# Altium footprint library MiscDevices.PcbLib: 251 footprints (part 16 of 16)
Each footprint in its own frame and in the unit in brackets; x right, y up, seen from the top. Pads: shape width x height; smd on the part's side, far side on the other; paste and mask are expansions set on the pad; w line width, h text height; cw(c..) or ccw(c..) is an arc to the next point about the centre after c.
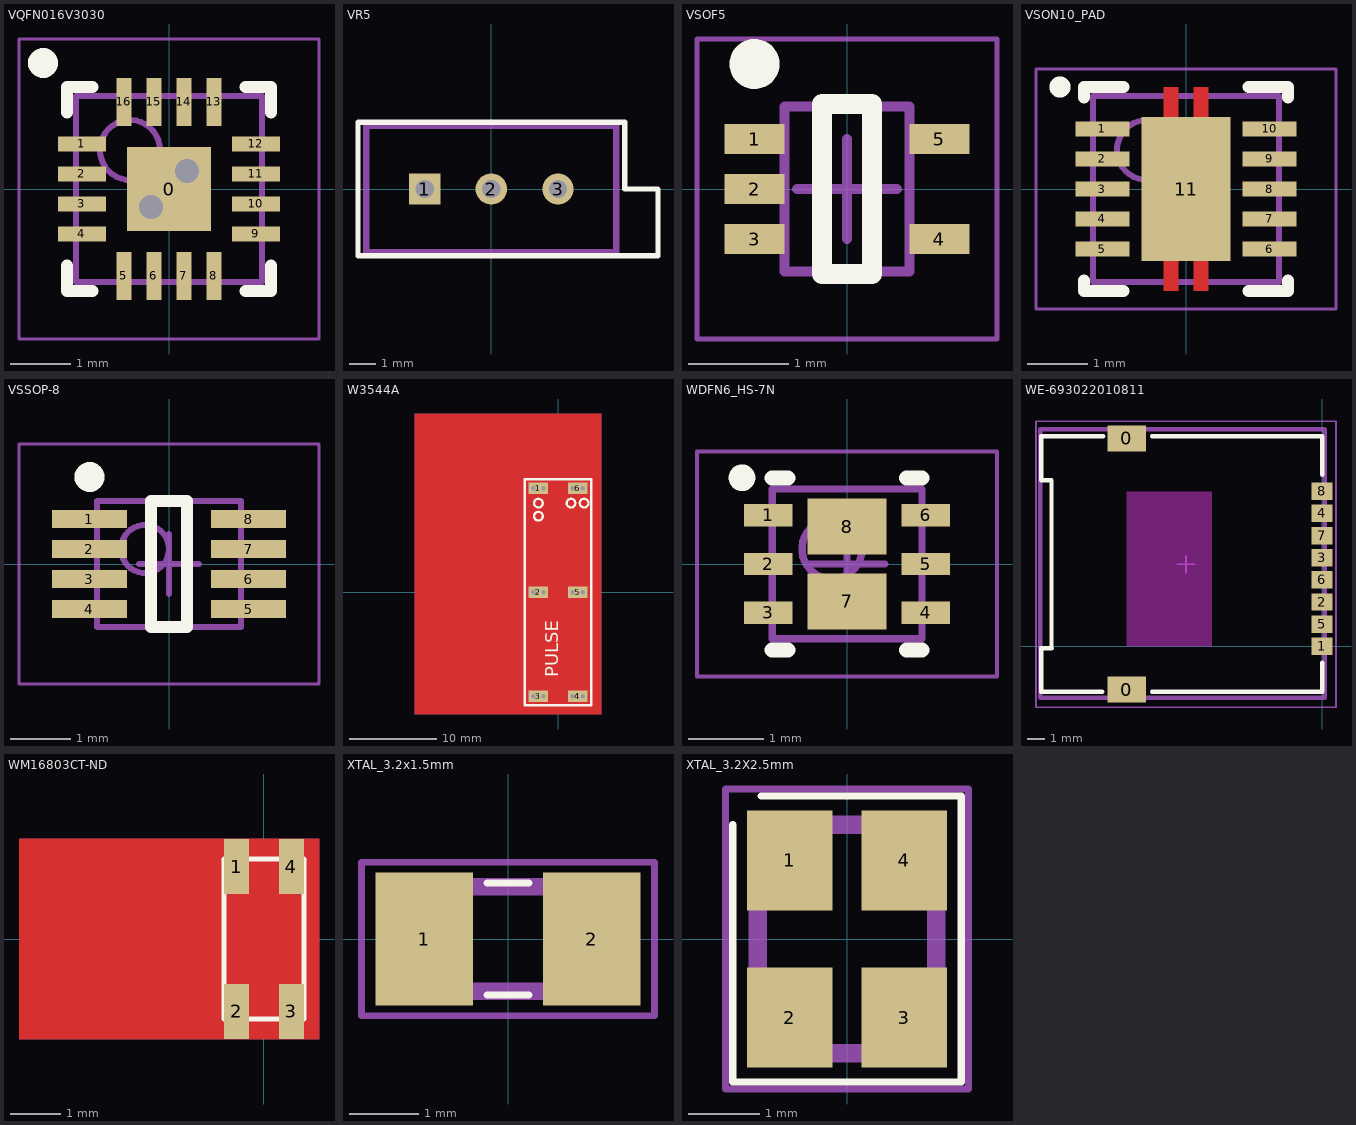
[diagram p15: the footprints below, top view; thin cyan lines are the x and y axes]

## VQFN016V3030 [mm] "QFN, 16-Leads, Body 3.00x3.00mm, Pitch 0.50mm, Thermal Pad 1.40x1.40mm, IPC Medium Density"
height 1
pads (17):
  rect 1.4x1.4 smd: 0(0,0)
  rect 0.8x0.25 smd: 1(-1.45,0.75) 2(-1.45,0.25) 3(-1.45,-0.25) 4(-1.45,-0.75) 9(1.45,-0.75) 10(1.45,-0.25) 11(1.45,0.25) 12(1.45,0.75)
  rect 0.25x0.8 smd: 5(-0.75,-1.45) 6(-0.25,-1.45) 7(0.25,-1.45) 8(0.75,-1.45) 13(0.75,1.45) 14(0.25,1.45) 15(-0.25,1.45) 16(-0.75,1.45)
via -0.3,-0.3 diameter 0.8 hole 0.4
via 0.3,0.3 diameter 0.8 hole 0.4
Top Overlay:
  circle w0.25: c-2.1,2.1 r0.125
  lines w0.2: -1.7,-1.275 -1.7,-1.7 -1.275,-1.7 ; -1.7,1.275 -1.7,1.7 -1.275,1.7 ; 1.275,-1.7 1.7,-1.7 1.7,-1.275 ; 1.275,1.7 1.7,1.7 1.7,1.275
Top Designator (Mech7):
  text ".Designator" at -3.809,-0.254 h0.76
Top Assembly:
  circle w0.1: c-0.65,0.65 r0.5
  lines w0.1: -1.55,-1.55 1.55,-1.55 1.55,1.55 -1.55,1.55 -1.55,-1.55
Top Courtyard:
  lines w0.05: -2.5,-2.5 2.5,-2.5 2.5,2.5 -2.5,2.5 -2.5,-2.5
  lines w0.1: -0.5,0 0.5,0 ; 0,-0.5 0,0.5
3D body "VQFN016V3030.step": height 1, standoff 0, extent -1.63,-1.63 1.63,1.63

## VR5 [mm] "Thru-Hole; 3 Leads"
height 18
pads (3):
  rect 1.2x1.2 hole 0.7: 1(-2.54,0)
  round 1.2 hole 0.7: 2(0,0) 3(2.54,0)
Top Overlay:
  lines w0.2: -5.08,-2.54 6.35,-2.54 6.35,0 5.08,0 5.08,2.54 -5.08,2.54 -5.08,-2.54
Top Designator (Mech7):
  text ".Designator" at -6.983,-0.508 h1.52
Top Assembly:
  lines w0.254: -4.765,-2.415 -4.765,2.415 4.765,2.415 4.765,-2.415 -4.765,-2.415
3D body "User Library-3296_Bourns.STEP": height 11.56, standoff -7.61, extent -4.765,-2.415 4.765,2.415

## VSOF5 [mm] "SOT23, 5-Leads, Body 1.60x1.60mm, Pitch 0.50mm, IPC Medium Density"
height 0.6
pads (5):
  rect 0.6x0.3 smd: 1(-0.925,0.5) 2(-0.925,0) 3(-0.925,-0.5) 4(0.925,-0.5) 5(0.925,0.5)
Top Overlay:
  circle w0.25: c-0.925,1.25 r0.125
  lines w0.2: -0.25,-0.85 0.25,-0.85 0.25,0.85 -0.25,0.85 -0.25,-0.85
Top Designator (Mech7):
  text ".Designator" at -3.809,-0.254 h0.76
Top Assembly:
  lines w0.1: -0.625,-0.825 -0.625,0.825 0.625,0.825 0.625,-0.825 -0.625,-0.825
Top Courtyard:
  lines w0.05: -1.5,-1.5 -1.5,1.5 1.5,1.5 1.5,-1.5 -1.5,-1.5
  lines w0.1: -0.5,0 0.5,0 ; 0,-0.5 0,0.5
3D body "User Library-SOTFL50P160X60-5N.STEP": height 0.6, standoff 0, extent -0.8,-0.823 0.8,0.823

## VSON10_PAD [mm]
height 1
pads (11):
  rect 0.9x0.25 smd: 1(-1.395,1) 2(-1.395,0.5) 3(-1.395,0) 4(-1.395,-0.5) 5(-1.395,-1) 6(1.395,-1) 7(1.395,-0.5) 8(1.395,0) 9(1.395,0.5) 10(1.395,1)
  rect 1.49x2.4 smd: 11(0,0)
Top Layer:
  rectangle: -0.375,1.2 -0.125,1.7
  rectangle: 0.125,1.2 0.375,1.7
  rectangle: 0.125,-1.7 0.375,-1.2
  rectangle: -0.375,-1.7 -0.125,-1.2
Top Overlay:
  circle w0.254: c-2.1,1.7 r0.05
  lines w0.2: -1.7,-1.525 -1.7,-1.7 -1.045,-1.7 ; -1.7,1.525 -1.7,1.7 -1.045,1.7 ; 1.045,-1.7 1.7,-1.7 1.7,-1.525 ; 1.045,1.7 1.7,1.7 1.7,1.525
Top Paste:
  rectangle: -0.375,-1.7 -0.125,-1.35
  rectangle: 0.125,-1.7 0.375,-1.35
  rectangle: 0.125,1.35 0.375,1.7
  rectangle: -0.375,1.35 -0.125,1.7
Top Solder:
  rectangle: -0.475,1.3 0.475,1.8
  rectangle: -0.475,-1.8 0.475,-1.3
Top Designator (Mech7):
  text ".Designator" at -6.094,-0.406 h1.22
Top Assembly:
  circle w0.1: c-0.65,0.65 r0.5
  lines w0.1: -1.55,-1.55 -1.55,1.55 1.55,1.55 1.55,-1.55 -1.55,-1.55
Top Courtyard:
  lines w0.05: -2.5,-2 -2.5,2 2.5,2 2.5,-2 -2.5,-2
  lines w0.1: -0.5,0 0.5,0 ; 0,-0.5 0,0.5
3D body "VSON10_PAD.step": height 1, standoff 0, extent -1.6,-1.55 1.6,1.55

## VSSOP-8 [mm] "TSSOP, 8-Leads, Body 2.00x2.30mm, Pitch 0.50mm, IPC Medium Density"
height 0.9
pads (8):
  rect 1.25x0.3 smd: 1(-1.325,0.75) 2(-1.325,0.25) 3(-1.325,-0.25) 4(-1.325,-0.75) 5(1.325,-0.75) 6(1.325,-0.25) 7(1.325,0.25) 8(1.325,0.75)
Top Overlay:
  circle w0.25: c-1.325,1.45 r0.125
  lines w0.2: -0.3,-1.05 0.3,-1.05 0.3,1.05 -0.3,1.05 -0.3,-1.05
Top Designator (Mech7):
  text ".Designator" at -6.094,-0.406 h1.22
Top Assembly:
  circle w0.1: c-0.4,0.25 r0.4
  lines w0.1: -1.2,-1.05 1.2,-1.05 1.2,1.05 -1.2,1.05 -1.2,-1.05
Top Courtyard:
  lines w0.05: -2.5,-2 2.5,-2 2.5,2 -2.5,2 -2.5,-2
  lines w0.1: -0.5,0 0.5,0 ; 0,-0.5 0,0.5
3D body "User Library-VSSOP8-1.STEP": height 0.9, standoff 0, extent -1.6,-1.05 1.6,1.05

## W3544A [mm] "PulseLarsen W3544A GSM/3G Antenna"
height 3
pads (6):
  rect 2.25x1.3 smd: 1(-2.27,11.95) 2(-2.27,0) 3(-2.27,-11.95) 4(2.27,-11.95) 5(2.27,0) 6(2.27,11.95)
via 1.67,11.95 diameter 1.016 hole 0.508
via 1.67,0 diameter 1.016 hole 0.508
via 1.67,-11.95 diameter 1.016 hole 0.508
via 2.87,11.95 diameter 1.016 hole 0.508
via 2.87,0 diameter 1.016 hole 0.508
via 2.87,-11.95 diameter 1.016 hole 0.508
via -2.87,11.95 diameter 1.016 hole 0.508
via -1.67,11.95 diameter 1.016 hole 0.508
via -1.67,-11.95 diameter 1.016 hole 0.508
via -1.67,0 diameter 1.016 hole 0.508
via -2.87,-11.95 diameter 1.016 hole 0.508
via -2.87,0 diameter 1.016 hole 0.508
Top Layer:
  pour cut-out: -16.5,20.5 -16.5,-14 5,-14 5,20.5
Bottom Layer:
  rectangle: -3.4,11.3 -1.15,12.6
  region: 3.4,12.6 1.15,12.6 1.15,11.3 3.4,11.3
  region: 3.4,0.65 1.15,0.65 1.15,-0.65 3.4,-0.65
  rectangle: -3.4,-0.65 -1.15,0.65
  region: 3.4,-11.3 1.15,-11.3 1.15,-12.6 3.4,-12.6
  rectangle: -3.4,-12.6 -1.15,-11.3
  pour cut-out: -16.5,-14 5,-14 5,20.5 -16.5,20.5
Top Overlay:
  circle w0.254: c1.5,10.25 r0.5
  circle w0.254: c3,10.25 r0.5
  circle w0.254: c-2.25,8.75 r0.5
  circle w0.254: c-2.25,10.25 r0.5
  lines w0.254: -3.825,-13 3.825,-13 3.825,13 -3.825,13 -3.825,-13
  text "PULSE" at 0,-9.75 h1.52
Bottom Solder:
  rectangle: -3.5,11.2 -1.05,12.7
  region: 3.5,12.7 1.05,12.7 1.05,11.2 3.5,11.2
  region: 3.5,0.75 1.05,0.75 1.05,-0.75 3.5,-0.75
  rectangle: -3.5,-0.75 -1.05,0.75
  region: 3.5,-11.2 1.05,-11.2 1.05,-12.7 3.5,-12.7
  rectangle: -3.5,-12.7 -1.05,-11.2
Top Designator (Mech7):
  text ".Designator" at -7.618,3.492 h1.52
Top Assembly:
  lines w0.254: -3.825,-13 3.825,-13 3.825,13 -3.825,13 -3.825,-13
Top Courtyard:
  circle w0.1: c-3.6,12.8 r0.25
  lines w0.1: -16.2,-13.7 4.5,-13.7 4.5,20 -16.2,20 -16.2,-13.7 ; -4,-13.2 -4,13.2 4,13.2 4,-13.2 -4,-13.2
3D body "w3544a.SLDPRT": height 3, standoff 0, extent -3.825,-13 3.825,13

## WDFN6_HS-7N [mm] "SON, 6-Leads, Body 2.00x2.00mm, Pitch 0.65mm, Thermal Pad 1.60x0.98mm, IPC Medium Density"
height 0.8
pads (8):
  rect 0.65x0.3 smd: 1(-1.05,0.65) 2(-1.05,0) 3(-1.05,-0.65) 4(1.05,-0.65) 5(1.05,0) 6(1.05,0.65)
  rect 1.05x0.75 smd: 7(0,-0.5) 8(0,0.5)
Top Overlay:
  circle w0.254: c-1.4,1.15 r0.05
  lines w0.2: -1,-1.15 -0.79,-1.15 ; -1,1.15 -0.79,1.15 ; 0.79,-1.15 1,-1.15 ; 0.79,1.15 1,1.15
Top Designator (Mech7):
  text ".Designator" at -3.809,-0.228 h0.76
Top Assembly:
  circle w0.1: c-0.2,0.2 r0.4
  lines w0.1: -1,-1 1,-1 1,1 -1,1 -1,-1
Top Courtyard:
  lines w0.05: -2,-1.5 2,-1.5 2,1.5 -2,1.5 -2,-1.5
  lines w0.1: -0.5,0 0.5,0 ; 0,-0.5 0,0.5
3D body: height 0.8, standoff 0.05, extent -1,-1 1,1

## WE-693022010811 [mm] "8-pos Connector Micro SIM SMD, R/A ,Hinged Lid,Wurth Electronics"
height 2
pads (10):
  rect 2.2x1.5 smd: 0(-11.2,-2.48) 0(-11.2,11.92)
  rect 1.2x1 smd: 1(0,0) 2(0,2.54) 3(0,5.08) 4(0,7.62) 5(0,1.27) 6(0,3.81) 7(0,6.35) 8(0,8.89)
Top Layer keep-out:
  rectangle: -11.2,0 -6.3,8.89
Top Overlay:
  lines w0.254: -16.1,12.01 -16.1,9.51 -15.51,9.51 -15.51,-0.09 -15.5,-0.1 -16.09,-0.1 -16.1,-0.11 -16.1,-2.61 -12.61,-2.61 ; -16.1,12.05 -12.55,12.05 ; -9.75,-2.61 0,-2.61 0,-0.94 ; -9.75,12.05 0,12.05 0,9.835 ; 0,9.835 0,9.835
Top Designator (Mech7):
  text ".Designator" at -15.418,5.992 h1.52
Top Assembly:
  lines w0.254: -16.15,12.45 -16.15,-2.95 0.15,-2.95 0.15,12.45 -16.1,12.45
Top Courtyard:
  lines w0.1: -8.3,4.7 -7.3,4.7 ; -7.8,4.2 -7.8,5.2 ; -16.4,-3.5 -16.4,12.9 0.8,12.9 0.8,-3.5 -16.4,-3.5
3D body "693022010811 (rev1).stp": height 1.94, standoff 0, extent -16.15,-2.95 0.15,12.45

## WM16803CT-ND [mm] "molex gps ant"
pads (4):
  rect 0.5x1.1 smd: 1(-0.55,1.45) 2(-0.55,-1.45) 3(0.55,-1.45) 4(0.55,1.45)
Top Layer:
  pour cut-out: 1.1,-2 1.1,2 -4.9,2 -4.9,-2
Bottom Layer:
  pour cut-out: -4.9,2 1.1,2 1.1,-2 -4.9,-2
Top Overlay:
  lines w0.1: -0.8,-1.6 -0.8,1.6 0.8,1.6 0.8,-1.6 -0.8,-1.6
Top Designator (Mech7):
  text ".Designator" at -7.994,-0.406 h1.22

## XTAL_3.2x1.5mm [mm] "Abracon 32.768 kHz XTAL SMD"
pads (2):
  rect 1.4x1.9 smd: 1(-1.2,0) 2(1.2,0)
Top Overlay:
  lines w0.1: -0.3,-0.8 0.3,-0.8 ; -0.3,0.8 0.3,0.8
Top Designator (Mech7):
  text ".Designator" at -3.809,-0.254 h0.76
Top Assembly:
  lines w0.254: -1.6,-0.5 -1.35,-0.75 -1,-0.75 ; -1.6,-0.75 1.6,-0.75 1.6,0.75 -1.6,0.75 -1.6,-0.75
Top Courtyard:
  lines w0.1: -2.1,-1.1 -2.1,1.1 2.1,1.1 2.1,-1.1 -2.1,-1.1
3D body "User Library-FX135A-327.STEP": height 0.92, standoff 0.01, extent -1.6,-0.75 1.6,0.75

## XTAL_3.2X2.5mm [mm]
height 12
pads (4):
  rect 1.2x1.4 smd: 1(-0.8,1.1) 2(-0.8,-1.1) 3(0.8,-1.1) 4(0.8,1.1)
Top Overlay:
  lines w0.1: -1.6,1.6 -1.6,-2 1.6,-2 1.6,2 -1.2,2
Top Designator (Mech7):
  text ".Designator" at -3.809,-0.254 h0.76
Top Assembly:
  lines w0.254: -1.25,1 -1,1.25 -0.65,1.6 -0.5,1.6 ; -1.25,-1.6 -1.25,1.6 1.25,1.6 1.25,-1.6 -1.25,-1.6
Top Courtyard:
  lines w0.1: -1.7,-2.1 -1.7,2.1 1.7,2.1 1.7,-2.1 -1.7,-2.1
3D body "User Library-ASE_series _ABRACON.STEP": height 1.21, standoff 0.01, extent -1.25,-1.6 1.25,1.6